# Altium footprint library Quectel.PCBLIB: 25 footprints (part 2 of 2)
Each footprint in its own frame and in the unit in brackets; x right, y up, seen from the top. Pads: shape width x height; smd on the part's side, far side on the other; paste and mask are expansions set on the pad; w line width, h text height; cw(c..) or ccw(c..) is an arc to the next point about the centre after c.
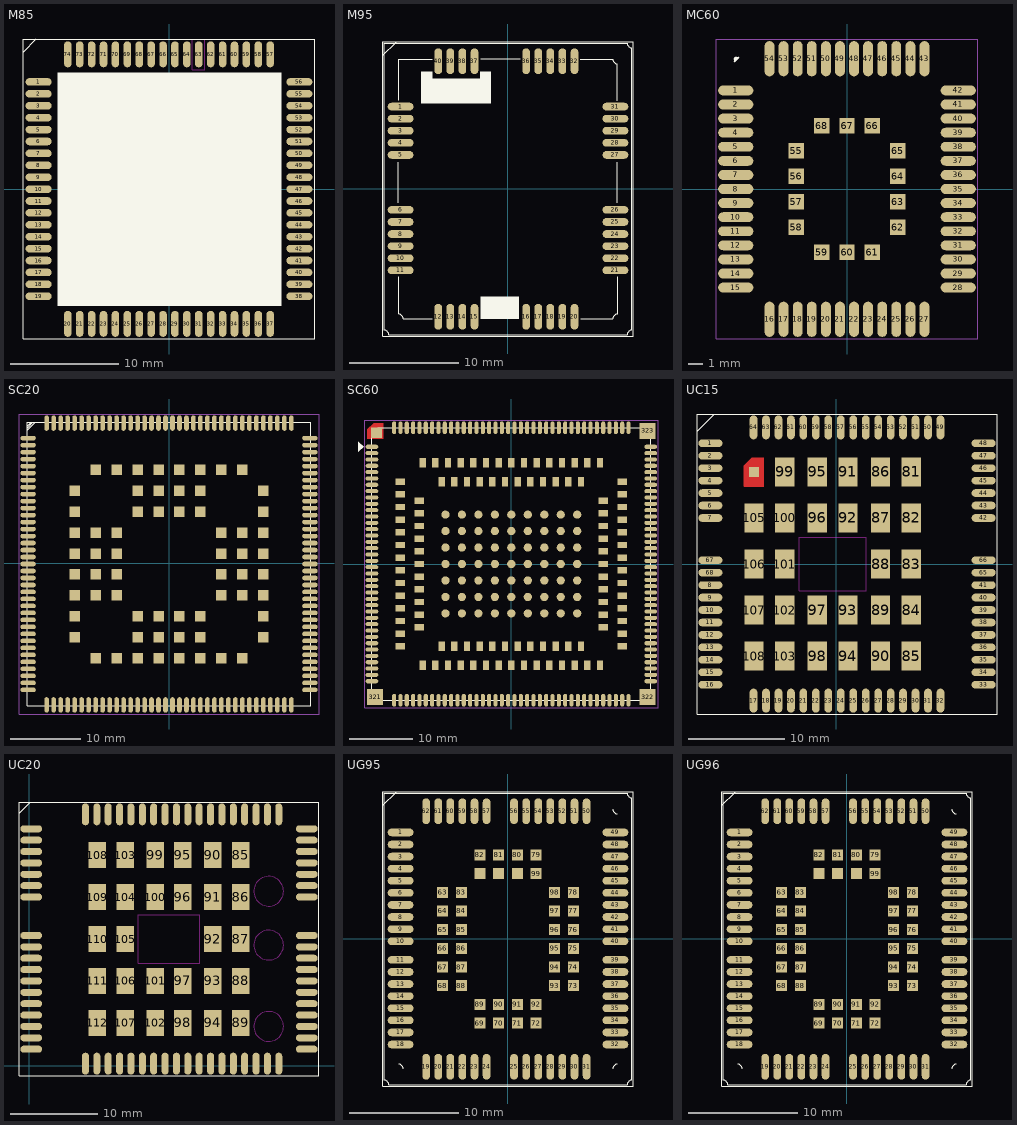
[diagram p1: the footprints below, top view; thin cyan lines are the x and y axes]

## M85 [mm]
pads (74):
  oval 2.4x0.7 smd: 1(-12.05,9.9) 2(-12.05,8.8) 3(-12.05,7.7) 4(-12.05,6.6) 5(-12.05,5.5) 6(-12.05,4.4) 7(-12.05,3.3) 8(-12.05,2.2) 9(-12.05,1.1) 10(-12.05,0) 11(-12.05,-1.1) 12(-12.05,-2.2) 13(-12.05,-3.3) 14(-12.05,-4.4) 15(-12.05,-5.5) 16(-12.05,-6.6) 17(-12.05,-7.7) 18(-12.05,-8.8) 19(-12.05,-9.9) 38(12.05,-9.9) 39(12.05,-8.8) 40(12.05,-7.7) 41(12.05,-6.6) 42(12.05,-5.5) 43(12.05,-4.4) 44(12.05,-3.3) 45(12.05,-2.2) 46(12.05,-1.1) 47(12.05,0) 48(12.05,1.1) 49(12.05,2.2) 50(12.05,3.3) 51(12.05,4.4) 52(12.05,5.5) 53(12.05,6.6) 54(12.05,7.7) 55(12.05,8.8) 56(12.05,9.9)
  oval 0.7x2.4 smd: 20(-9.35,-12.45) 21(-8.25,-12.45) 22(-7.15,-12.45) 23(-6.05,-12.45) 24(-4.95,-12.45) 25(-3.85,-12.45) 26(-2.75,-12.45) 27(-1.65,-12.45) 28(-0.55,-12.45) 29(0.55,-12.45) 30(1.65,-12.45) 31(2.75,-12.45) 32(3.85,-12.45) 33(4.95,-12.45) 34(6.05,-12.45) 35(7.15,-12.45) 36(8.25,-12.45) 37(9.35,-12.45) 57(9.35,12.45) 58(8.25,12.45) 59(7.15,12.45) 60(6.05,12.45) 61(4.95,12.45) 62(3.85,12.45) 63(2.75,12.45) 64(1.65,12.45) 65(0.55,12.45) 66(-0.55,12.45) 67(-1.65,12.45) 68(-2.75,12.45) 69(-3.85,12.45) 70(-4.95,12.45) 71(-6.05,12.45) 72(-7.15,12.45) 73(-8.25,12.45) 74(-9.35,12.45)
Top Overlay:
  rectangle: -10.287,-10.795 10.414,10.795
  lines w0.1: -13.45,-13.85 13.45,-13.85 13.45,13.85 -13.45,13.85 -13.45,-13.85
  lines w0.102: -13.437,12.675 -12.243,13.868
Keep-Out Layer:
  lines w0.102: 2.159,13.843 2.159,11.049 3.302,11.049 3.302,13.843
3D body "User Library-QuectelM85.step": height 2.6, standoff -0.01, extent -12.243,-12.649 12.257,12.651

## M95 [mm]
pads (40):
  oval 2.35x0.7 smd: 1(-9.775,7.5) 2(-9.775,6.4) 3(-9.775,5.3) 4(-9.775,4.2) 5(-9.775,3.1) 6(-9.775,-1.9) 7(-9.775,-3) 8(-9.775,-4.1) 9(-9.775,-5.2) 10(-9.775,-6.3) 11(-9.775,-7.4) 21(9.775,-7.4) 22(9.775,-6.3) 23(9.775,-5.2) 24(9.775,-4.1) 25(9.775,-3) 26(9.775,-1.9) 27(9.775,3.1) 28(9.775,4.2) 29(9.775,5.3) 30(9.775,6.4) 31(9.775,7.5)
  oval 0.7x2.35 smd: 12(-6.35,-11.625) 13(-5.25,-11.625) 14(-4.15,-11.625) 15(-3.05,-11.625) 16(1.65,-11.625) 17(2.75,-11.625) 18(3.85,-11.625) 19(4.95,-11.625) 20(6.05,-11.625) 32(6.05,11.625) 33(4.95,11.625) 34(3.85,11.625) 35(2.75,11.625) 36(1.65,11.625) 37(-3.05,11.625) 38(-4.15,11.625) 39(-5.25,11.625) 40(-6.35,11.625)
Top Overlay:
  rectangle: -2.565,7.772 -1.549,10.693
  rectangle: -7.899,7.772 -6.883,10.693
  rectangle: -7.01,7.772 -2.565,10.058
  rectangle: -2.489,-11.811 0.991,-9.804
  lines w0.1: -10.001,-1.27 -10.001,2.453 ; -9.95,-11.4 cw(c-9.95,-11.8) -9.55,-11.8 -6.883,-11.8 ; -9.95,-11.354 -9.95,-8.001 ; -9.95,8.077 -9.95,11.8 -6.883,11.8 ; -2.464,11.836 1.092,11.836 ; 6.579,11.786 9.55,11.786 ; 6.604,-11.8 9.55,-11.8 cw(c9.95,-11.8) 9.95,-11.4 ; 9.55,11.8 ccw(c9.95,11.8) 9.95,11.4 9.95,8.052 ; 9.938,-1.27 9.938,2.453 ; 9.989,-11.379 9.989,-7.976 ; -11.4,-13.4 -11.4,13.4 11.4,13.4 11.4,-13.4 -11.4,-13.4 ; -11.25,-12.85 cw(c-11.25,-13.25) -10.85,-13.25 10.85,-13.25 cw(c11.25,-13.25) 11.25,-12.85 11.25,12.85 cw(c11.25,13.25) 10.85,13.25 -11.25,13.25 -11.25,-12.85
  lines w0.102: -11.379,12.167 -10.185,13.36
3D body "M95_3d_150727_asm.stp": height 2.65, standoff 0, extent -9.957,-11.811 9.943,11.789

## MC60 [mm]
pads (68):
  oval 2.5x0.7 smd: 1(-7.9,7) 2(-7.9,6) 3(-7.9,5) 4(-7.9,4) 5(-7.9,3) 6(-7.9,2) 7(-7.9,1) 8(-7.9,0) 9(-7.9,-1) 10(-7.9,-2) 11(-7.9,-3) 12(-7.9,-4) 13(-7.9,-5) 14(-7.9,-6) 15(-7.9,-7) 28(7.9,-7) 29(7.9,-6) 30(7.9,-5) 31(7.9,-4) 32(7.9,-3) 33(7.9,-2) 34(7.9,-1) 35(7.9,0) 36(7.9,1) 37(7.9,2) 38(7.9,3) 39(7.9,4) 40(7.9,5) 41(7.9,6) 42(7.9,7)
  oval 0.7x2.5 smd: 16(-5.5,-9.25) 17(-4.5,-9.25) 18(-3.5,-9.25) 19(-2.5,-9.25) 20(-1.5,-9.25) 21(-0.5,-9.25) 22(0.5,-9.25) 23(1.5,-9.25) 24(2.5,-9.25) 25(3.5,-9.25) 26(4.5,-9.25) 27(5.5,-9.25) 43(5.5,9.25) 44(4.5,9.25) 45(3.5,9.25) 46(2.5,9.25) 47(1.5,9.25) 48(0.5,9.25) 49(-0.5,9.25) 50(-1.5,9.25) 51(-2.5,9.25) 52(-3.5,9.25) 53(-4.5,9.25) 54(-5.5,9.25)
  rect 1.1x1.1 smd: 55(-3.6,2.7) 56(-3.6,0.9) 57(-3.6,-0.9) 58(-3.6,-2.7) 59(-1.8,-4.5) 60(0,-4.5) 61(1.8,-4.5) 62(3.6,-2.7) 63(3.6,-0.9) 64(3.6,0.9) 65(3.6,2.7) 66(1.8,4.5) 67(0,4.5) 68(-1.8,4.5)
Top Overlay:
  lines w0.1: -8,9.05 -7.7,9.35 ; -8,9.15 -7.8,9.35 ; -8,9.25 -7.9,9.35
Mechanical 1:
  lines w0.01: -9.3,-10.65 -9.3,10.65 9.3,10.65 9.3,-10.65 -9.3,-10.65
3D body "Quectel MC60.step": height 2.1, standoff 0, extent -8.001,-9.351 8.001,9.351

## SC20 [mm]
pads (210):
  oval 2.2x0.65 smd mask+0.05: 1(-20.15,17.873) 2(-20.15,16.873) 3(-20.15,15.873) 4(-20.15,14.873) 5(-20.15,13.873) 6(-20.15,12.873) 7(-20.15,11.873) 8(-20.15,10.873) 9(-20.15,9.873) 10(-20.15,8.873) 11(-20.15,7.873) 12(-20.15,6.873) 13(-20.15,5.873) 14(-20.15,4.873) 15(-20.15,3.873) 16(-20.15,2.873) 17(-20.15,1.873) 18(-20.15,0.873) 19(-20.15,-0.127) 20(-20.15,-1.127) 21(-20.15,-2.127) 22(-20.15,-3.127) 23(-20.15,-4.127) 24(-20.15,-5.127) 25(-20.15,-6.127) 26(-20.15,-7.127) 27(-20.15,-8.127) 28(-20.15,-9.127) 29(-20.15,-10.127) 30(-20.15,-11.127) 31(-20.15,-12.127) 32(-20.15,-13.127) 33(-20.15,-14.127) 34(-20.15,-15.127) 35(-20.15,-16.127) 36(-20.15,-17.127) 37(-20.15,-18.127) 74(20.15,-18.127) 75(20.15,-17.127) 76(20.15,-16.127) 77(20.15,-15.127) 78(20.15,-14.127) 79(20.15,-13.127) 80(20.15,-12.127) 81(20.15,-11.127) 82(20.15,-10.127) 83(20.15,-9.127) 84(20.15,-8.127) 85(20.15,-7.127) 86(20.15,-6.127) 87(20.15,-5.127) 88(20.15,-4.127) 89(20.15,-3.127) 90(20.15,-2.127) 91(20.15,-1.127) 92(20.15,-0.127) 93(20.15,0.873) 94(20.15,1.873) 95(20.15,2.873) 96(20.15,3.873) 97(20.15,4.873) 98(20.15,5.873) 99(20.15,6.873) 100(20.15,7.873) 101(20.15,8.873) 102(20.15,9.873) 103(20.15,10.873) 104(20.15,11.873) 105(20.15,12.873) 106(20.15,13.873) 107(20.15,14.873) 108(20.15,15.873) 109(20.15,16.873) 110(20.15,17.873)
  oval 0.65x2.2 smd mask+0.05: 38(-17.5,-20.277) 39(-16.5,-20.277) 40(-15.5,-20.277) 41(-14.5,-20.277) 42(-13.5,-20.277) 43(-12.5,-20.277) 44(-11.5,-20.277) 45(-10.5,-20.277) 46(-9.5,-20.277) 47(-8.5,-20.277) 48(-7.5,-20.277) 49(-6.5,-20.277) 50(-5.5,-20.277) 51(-4.5,-20.277) 52(-3.5,-20.277) 53(-2.5,-20.277) 54(-1.5,-20.277) 55(-0.5,-20.277) 56(0.5,-20.277) 57(1.5,-20.277) 58(2.5,-20.277) 59(3.5,-20.277) 60(4.5,-20.277) 61(5.5,-20.277) 62(6.5,-20.277) 63(7.5,-20.277) 64(8.5,-20.277) 65(9.5,-20.277) 66(10.5,-20.277) 67(11.5,-20.277) 68(12.5,-20.277) 69(13.5,-20.277) 70(14.5,-20.277) 71(15.5,-20.277) 72(16.5,-20.277) 73(17.5,-20.277) 111(17.5,20.023) 112(16.5,20.023) 113(15.5,20.023) 114(14.5,20.023) 115(13.5,20.023) 116(12.5,20.023) 117(11.5,20.023) 118(10.5,20.023) 119(9.5,20.023) 120(8.5,20.023) 121(7.5,20.023) 122(6.5,20.023) 123(5.5,20.023) 124(4.5,20.023) 125(3.5,20.023) 126(2.5,20.023) 127(1.5,20.023) 128(0.5,20.023) 129(-0.5,20.023) 130(-1.5,20.023) 131(-2.5,20.023) 132(-3.5,20.023) 133(-4.5,20.023) 134(-5.5,20.023) 135(-6.5,20.023) 136(-7.5,20.023) 137(-8.5,20.023) 138(-9.5,20.023) 139(-10.5,20.023) 140(-11.5,20.023) 141(-12.5,20.023) 142(-13.5,20.023) 143(-14.5,20.023) 144(-15.5,20.023) 145(-16.5,20.023) 146(-17.5,20.023)
  rect 1.5x1.5 smd mask+0.05: 147(-13.5,10.373) 148(-13.5,7.373) 149(-13.5,4.373) 150(-13.5,1.373) 151(-13.5,-1.627) 152(-13.5,-4.627) 153(-13.5,-7.627) 154(-13.5,-10.627) 155(-10.5,-13.627) 156(-7.5,-13.627) 157(-4.5,-13.627) 158(-1.5,-13.627) 159(1.5,-13.627) 160(4.5,-13.627) 161(7.5,-13.627) 162(10.5,-13.627) 163(13.5,-10.627) 164(13.5,-7.627) 165(13.5,-4.627) 166(13.5,-1.627) 167(13.5,1.373) 168(13.5,4.373) 169(13.5,7.373) 170(13.5,10.373) 171(10.5,13.373) 172(7.5,13.373) 173(4.5,13.373) 174(1.5,13.373) 175(-1.5,13.373) 176(-4.5,13.373) 177(-7.5,13.373) 178(-10.5,13.373) 179(-10.5,4.373) 180(-10.5,1.373) 181(-10.5,-1.627) 182(-10.5,-4.627) 183(-4.5,-10.627) 184(-1.5,-10.627) 185(1.5,-10.627) 186(4.5,-10.627) 187(10.5,-4.627) 188(10.5,-1.627) 189(10.5,1.373) 190(10.5,4.373) 191(4.5,10.373) 192(1.5,10.373) 193(-1.5,10.373) 194(-4.5,10.373) 195(-7.5,4.373) 196(-7.5,1.373) 197(-7.5,-1.627) 198(-7.5,-4.627) 199(-4.5,-7.627) 200(-1.5,-7.627) 201(1.5,-7.627) 202(4.5,-7.627) 203(7.5,-4.627) 204(7.5,-1.627) 205(7.5,1.373) 206(7.5,4.373) 207(4.5,7.373) 208(1.5,7.373) 209(-1.5,7.373) 210(-4.5,7.373)
Top Overlay:
  lines w0.1: -20.2,19.073 -19.2,20.073 ; -20.2,19.373 -19.45,20.123 ; -20.2,19.673 -19.8,20.073 ; -20.25,-20.377 -20.25,20.123 20.25,20.123 20.25,-20.377 -20.25,-20.377
Mechanical 1:
  lines w0.01: -21.45,-21.577 -21.45,21.323 21.45,21.323 21.45,-21.577 -21.45,-21.577

## SC60 [mm]
pads (323):
  oval 2x0.65 smd mask+0.05: 1(-22,18.5) 2(-22,17.5) 3(-22,16.5) 4(-22,15.5) 5(-22,14.5) 6(-22,13.5) 7(-22,12.5) 8(-22,11.5) 9(-22,10.5) 10(-22,9.5) 11(-22,8.5) 12(-22,7.5) 13(-22,6.5) 14(-22,5.5) 15(-22,4.5) 16(-22,3.5) 17(-22,2.5) 18(-22,1.5) 19(-22,0.5) 20(-22,-0.5) 21(-22,-1.5) 22(-22,-2.5) 23(-22,-3.5) 24(-22,-4.5) 25(-22,-5.5) 26(-22,-6.5) 27(-22,-7.5) 28(-22,-8.5) 29(-22,-9.5) 30(-22,-10.5) 31(-22,-11.5) 32(-22,-12.5) 33(-22,-13.5) 34(-22,-14.5) 35(-22,-15.5) 36(-22,-16.5) 37(-22,-17.5) 38(-22,-18.5) 77(22,-18.5) 78(22,-17.5) 79(22,-16.5) 80(22,-15.5) 81(22,-14.5) 82(22,-13.5) 83(22,-12.5) 84(22,-11.5) 85(22,-10.5) 86(22,-9.5) 87(22,-8.5) 88(22,-7.5) 89(22,-6.5) 90(22,-5.5) 91(22,-4.5) 92(22,-3.5) 93(22,-2.5) 94(22,-1.5) 95(22,-0.5) 96(22,0.5) 97(22,1.5) 98(22,2.5) 99(22,3.5) 100(22,4.5) 101(22,5.5) 102(22,6.5) 103(22,7.5) 104(22,8.5) 105(22,9.5) 106(22,10.5) 107(22,11.5) 108(22,12.5) 109(22,13.5) 110(22,14.5) 111(22,15.5) 112(22,16.5) 113(22,17.5) 114(22,18.5)
  oval 0.65x2 smd mask+0.05: 39(-18.5,-21.5) 40(-17.5,-21.5) 41(-16.5,-21.5) 42(-15.5,-21.5) 43(-14.5,-21.5) 44(-13.5,-21.5) 45(-12.5,-21.5) 46(-11.5,-21.5) 47(-10.5,-21.5) 48(-9.5,-21.5) 49(-8.5,-21.5) 50(-7.5,-21.5) 51(-6.5,-21.5) 52(-5.5,-21.5) 53(-4.5,-21.5) 54(-3.5,-21.5) 55(-2.5,-21.5) 56(-1.5,-21.5) 57(-0.5,-21.5) 58(0.5,-21.5) 59(1.5,-21.5) 60(2.5,-21.5) 61(3.5,-21.5) 62(4.5,-21.5) 63(5.5,-21.5) 64(6.5,-21.5) 65(7.5,-21.5) 66(8.5,-21.5) 67(9.5,-21.5) 68(10.5,-21.5) 69(11.5,-21.5) 70(12.5,-21.5) 71(13.5,-21.5) 72(14.5,-21.5) 73(15.5,-21.5) 74(16.5,-21.5) 75(17.5,-21.5) 76(18.5,-21.5) 115(18.5,21.5) 116(17.5,21.5) 117(16.5,21.5) 118(15.5,21.5) 119(14.5,21.5) 120(13.5,21.5) 121(12.5,21.5) 122(11.5,21.5) 123(10.5,21.5) 124(9.5,21.5) 125(8.5,21.5) 126(7.5,21.5) 127(6.5,21.5) 128(5.5,21.5) 129(4.5,21.5) 130(3.5,21.5) 131(2.5,21.5) 132(1.5,21.5) 133(0.5,21.5) 134(-0.5,21.5) 135(-1.5,21.5) 136(-2.5,21.5) 137(-3.5,21.5) 138(-4.5,21.5) 139(-5.5,21.5) 140(-6.5,21.5) 141(-7.5,21.5) 142(-8.5,21.5) 143(-9.5,21.5) 144(-10.5,21.5) 145(-11.5,21.5) 146(-12.5,21.5) 147(-13.5,21.5) 148(-14.5,21.5) 149(-15.5,21.5) 150(-16.5,21.5) 151(-17.5,21.5) 152(-18.5,21.5)
  rect 1.5x1 smd mask+0.05: 153(-17.5,13) 154(-17.5,11) 155(-17.5,9) 156(-17.5,7) 157(-17.5,5) 158(-17.5,3) 159(-17.5,1) 160(-17.5,-1) 161(-17.5,-3) 162(-17.5,-5) 163(-17.5,-7) 164(-17.5,-9) 165(-17.5,-11) 166(-17.5,-13) 182(17.5,-13) 183(17.5,-11) 184(17.5,-9) 185(17.5,-7) 186(17.5,-5) 187(17.5,-3) 188(17.5,-1) 189(17.5,1) 190(17.5,3) 191(17.5,5) 192(17.5,7) 193(17.5,9) 194(17.5,11) 195(17.5,13) 211(-14.5,10) 212(-14.5,8) 213(-14.5,6) 214(-14.5,4) 215(-14.5,2) 216(-14.5,0) 217(-14.5,-2) 218(-14.5,-4) 219(-14.5,-6) 220(-14.5,-8) 221(-14.5,-10) 234(14.5,-10) 235(14.5,-8) 236(14.5,-6) 237(14.5,-4) 238(14.5,-2) 239(14.5,0) 240(14.5,2) 241(14.5,4) 242(14.5,6) 243(14.5,8) 244(14.5,10)
  rect 1x1.5 smd mask+0.05: 167(-14,-16) 168(-12,-16) 169(-10,-16) 170(-8,-16) 171(-6,-16) 172(-4,-16) 173(-2,-16) 174(0,-16) 175(2,-16) 176(4,-16) 177(6,-16) 178(8,-16) 179(10,-16) 180(12,-16) 181(14,-16) 196(14,16) 197(12,16) 198(10,16) 199(8,16) 200(6,16) 201(4,16) 202(2,16) 203(0,16) 204(-2,16) 205(-4,16) 206(-6,16) 207(-8,16) 208(-10,16) 209(-12,16) 210(-14,16) 222(-11,-13) 223(-9,-13) 224(-7,-13) 225(-5,-13) 226(-3,-13) 227(-1,-13) 228(1,-13) 229(3,-13) 230(5,-13) 231(7,-13) 232(9,-13) 233(11,-13) 245(11,13) 246(9,13) 247(7,13) 248(5,13) 249(3,13) 250(1,13) 251(-1,13) 252(-3,13) 253(-5,13) 254(-7,13) 255(-9,13) 256(-11,13)
  round 1.3 smd mask+0.05: 257(-10.4,7.8) 258(-10.4,5.2) 259(-10.4,2.6) 260(-10.4,0) 261(-10.4,-2.6) 262(-10.4,-5.2) 263(-10.4,-7.8) 264(-7.8,7.8) 265(-7.8,5.2) 266(-7.8,2.6) 267(-7.8,0) 268(-7.8,-2.6) 269(-7.8,-5.2) 270(-7.8,-7.8) 271(-5.2,7.8) 272(-5.2,5.2) 273(-5.2,2.6) 274(-5.2,0) 275(-5.2,-2.6) 276(-5.2,-5.2) 277(-5.2,-7.8) 278(-2.6,7.8) 279(-2.6,5.2) 280(-2.6,2.6) 281(-2.6,0) 282(-2.6,-2.6) 283(-2.6,-5.2) 284(-2.6,-7.8) 285(0,7.8) 286(0,5.2) 287(0,2.6) 288(0,0) 289(0,-2.6) 290(0,-5.2) 291(0,-7.8) 292(2.6,7.8) 293(2.6,5.2) 294(2.6,2.6) 295(2.6,0) 296(2.6,-2.6) 297(2.6,-5.2) 298(2.6,-7.8) 299(5.2,7.8) 300(5.2,5.2) 301(5.2,2.6) 302(5.2,0) 303(5.2,-2.6) 304(5.2,-5.2) 305(5.2,-7.8) 306(7.8,7.8) 307(7.8,5.2) 308(7.8,2.6) 309(7.8,0) 310(7.8,-2.6) 311(7.8,-5.2) 312(7.8,-7.8) 313(10.4,7.8) 314(10.4,5.2) 315(10.4,2.6) 316(10.4,0) 317(10.4,-2.6) 318(10.4,-5.2) 319(10.4,-7.8)
  rect 1.7x1.7 smd: 320(-21.266,20.723)
  rect 2.5x2.5 smd mask+0.05: 321(-21.5,-21) 322(21.5,-21) 323(21.5,21)
Top Layer:
  region: -20.25,19.75 -20.25,22.25 -21.75,22.25 -22.75,21.25 -22.75,19.75
Top Overlay:
  region: -23.3,18.5 -24.2,19.271 -24.2,17.729
  lines w0.1: -22,-21.5 -22,20.5 -21,21.5 22,21.5 22,-21.5 -22,-21.5
Top Paste:
  region: -20.25,19.75 -20.25,22.25 -21.75,22.25 -22.75,21.25 -22.75,19.75
Top Solder:
  region: -20.2,19.7 -20.2,22.3 -21.8,22.3 -22.8,21.3 -22.8,19.7
Mechanical 1:
  lines w0.01: -23.15,-22.65 -23.15,22.65 23.15,22.65 23.15,-22.65 -23.15,-22.65

## UC15 [mm]
pads (108):
  oval 2.5x0.8 smd: 1(-13.107,12.6) 2(-13.107,11.3) 3(-13.107,10) 4(-13.107,8.7) 5(-13.107,7.4) 6(-13.107,6.1) 7(-13.107,4.8) 8(-13.107,-2.2) 9(-13.107,-3.5) 10(-13.107,-4.8) 11(-13.107,-6.1) 12(-13.107,-7.4) 13(-13.107,-8.7) 14(-13.107,-10) 15(-13.107,-11.3) 16(-13.107,-12.6) 33(15.393,-12.6) 34(15.393,-11.3) 35(15.393,-10) 36(15.393,-8.7) 37(15.393,-7.4) 38(15.393,-6.1) 39(15.393,-4.8) 40(15.393,-3.5) 41(15.393,-2.2) 42(15.393,4.8) 43(15.393,6.1) 44(15.393,7.4) 45(15.393,8.7) 46(15.393,10) 47(15.393,11.3) 48(15.393,12.6) 65(15.393,-0.9) 66(15.393,0.4) 67(-13.107,0.4) 68(-13.107,-0.9)
  oval 0.8x2.5 smd: 17(-8.607,-14.25) 18(-7.307,-14.25) 19(-6.007,-14.25) 20(-4.707,-14.25) 21(-3.407,-14.25) 22(-2.107,-14.25) 23(-0.807,-14.25) 24(0.493,-14.25) 25(1.793,-14.25) 26(3.093,-14.25) 27(4.393,-14.25) 28(5.693,-14.25) 29(6.993,-14.25) 30(8.293,-14.25) 31(9.593,-14.25) 32(10.893,-14.25) 49(10.893,14.25) 50(9.593,14.25) 51(8.293,14.25) 52(6.993,14.25) 53(5.693,14.25) 54(4.393,14.25) 55(3.093,14.25) 56(1.793,14.25) 57(0.493,14.25) 58(-0.807,14.25) 59(-2.107,14.25) 60(-3.407,14.25) 61(-4.707,14.25) 62(-6.007,14.25) 63(-7.307,14.25) 64(-8.607,14.25)
  rect 0x0 smd: 69(2.043,1.6) 70(2.043,0) 71(2.043,-1.6) 72(0.443,1.6) 73(0.443,0) 74(0.443,-1.6) 75(-1.157,1.6) 76(-1.157,0) 77(-1.157,-1.6) 78(-2.757,1.6) 79(-2.757,0) 80(-2.757,-1.6)
  rect 2x3 smd: 81(7.843,9.6) 82(7.843,4.8) 83(7.843,0) 84(7.843,-4.8) 85(7.843,-9.6) 86(4.643,9.6) 87(4.643,4.8) 88(4.643,0) 89(4.643,-4.8) 90(4.643,-9.6) 91(1.243,9.6) 92(1.243,4.8) 93(1.243,-4.8) 94(1.243,-9.6) 95(-1.957,9.6) 96(-1.957,4.8) 97(-1.957,-4.8) 98(-1.957,-9.6) 99(-5.357,9.6) 100(-5.357,4.8) 101(-5.357,0) 102(-5.357,-4.8) 103(-5.357,-9.6) 105(-8.557,4.8) 106(-8.557,0) 107(-8.557,-4.8) 108(-8.557,-9.6)
  rect 1x1 smd: 104(-8.557,9.6)
Top Layer:
  region: -8.738,11.074 -8.738,8.103 -7.569,8.103 -7.569,11.074
  region: -9.55,10.262 -9.55,8.128 -8.661,8.128 -8.661,10.262
  region: -9.096,9.801 -8.268,10.63 -8.738,11.1 -9.566,10.271
  lines w0.102: -9.557,8.1 -9.557,10.275 -8.732,11.1 -7.557,11.1 -7.557,8.1 -9.557,8.1
Top Layer keep-out:
  lines w0.102: -3.857,-2.8 -3.857,2.8 3.143,2.8 3.143,-2.8 -3.857,-2.8
Top Overlay:
  lines w0.1: -14.507,-15.65 16.793,-15.65 16.793,15.65 -14.507,15.65 -14.507,-15.65 ; -14.507,13.865 -12.722,15.625 -14.507,15.625 -14.507,13.865
Top Paste:
  region: -8.738,11.074 -8.738,8.103 -7.595,8.103 -7.595,11.074
  region: -9.525,10.262 -9.525,8.103 -8.687,8.103 -8.687,10.262
  region: -9.097,9.8 -8.268,10.63 -8.742,11.104 -9.572,10.274
  lines w0.102: -9.557,8.1 -9.557,10.275 -8.732,11.1 -7.557,11.1 -7.557,8.1 -9.557,8.1
Top Solder:
  region: -9.18,9.921 -8.395,10.706 -8.812,11.123 -9.597,10.338
  region: -9.601,10.338 -9.601,8.077 -8.788,8.077 -8.788,10.338
  region: -8.814,11.125 -8.814,8.077 -7.544,8.077 -7.544,11.125
  lines w0.102: -9.607,8.05 -9.607,10.325 -8.782,11.15 -7.507,11.15 -7.507,8.05 -9.607,8.05
3D body "uc15_3d_150714_asm.stp": height 2.5, standoff 0, extent -13.36,-14.503 15.64,14.497

## UC20 [mm]
pads (112):
  oval 2.5x0.8 smd: 1(0.238,27.093) 2(0.238,25.793) 3(0.238,24.493) 4(0.238,23.193) 5(0.238,21.893) 6(0.238,20.593) 7(0.238,19.293) 8(0.238,14.893) 9(0.238,13.593) 10(0.238,12.293) 11(0.238,10.993) 12(0.238,9.693) 13(0.238,8.393) 14(0.238,7.093) 15(0.238,5.793) 16(0.238,4.493) 17(0.238,3.193) 18(0.238,1.893) 37(31.738,1.893) 38(31.738,3.193) 39(31.738,4.493) 40(31.738,5.793) 41(31.738,7.093) 42(31.738,8.393) 43(31.738,9.693) 44(31.738,10.993) 45(31.738,12.293) 46(31.738,13.593) 47(31.738,14.893) 48(31.738,19.293) 49(31.738,20.593) 50(31.738,21.893) 51(31.738,23.193) 52(31.738,24.493) 53(31.738,25.793) 54(31.738,27.093)
  oval 0.8x2.5 smd: 19(6.438,0.243) 20(7.738,0.243) 21(9.038,0.243) 22(10.338,0.243) 23(11.638,0.243) 24(12.938,0.243) 25(14.238,0.243) 26(15.538,0.243) 27(16.838,0.243) 28(18.138,0.243) 29(19.438,0.243) 30(20.738,0.243) 31(22.038,0.243) 32(23.338,0.243) 33(24.638,0.243) 34(25.938,0.243) 35(27.238,0.243) 36(28.538,0.243) 55(28.538,28.743) 56(27.238,28.743) 57(25.938,28.743) 58(24.638,28.743) 59(23.338,28.743) 60(22.038,28.743) 61(20.738,28.743) 62(19.438,28.743) 63(18.138,28.743) 64(16.838,28.743) 65(15.538,28.743) 66(14.238,28.743) 67(12.938,28.743) 68(11.638,28.743) 69(10.338,28.743) 70(9.038,28.743) 71(7.738,28.743) 72(6.438,28.743)
  rect 0x0 smd: 73(18.388,16.093) 74(18.388,14.493) 75(18.388,12.893) 76(16.788,16.093) 77(16.788,14.493) 78(16.788,12.893) 79(15.188,16.093) 80(15.188,14.493) 81(15.188,12.893) 82(13.588,16.093) 83(13.588,14.493) 84(13.588,12.893)
  rect 2x3 smd: 85(24.188,24.093) 86(24.188,19.293) 87(24.188,14.493) 88(24.188,9.693) 89(24.188,4.893) 90(20.988,24.093) 91(20.988,19.293) 92(20.988,14.493) 93(20.988,9.693) 94(20.988,4.893) 95(17.588,24.093) 96(17.588,19.293) 97(17.588,9.693) 98(17.588,4.893) 99(14.388,24.093) 100(14.388,19.293) 101(14.388,9.693) 102(14.388,4.893) 103(10.988,24.093) 104(10.988,19.293) 105(10.988,14.493) 106(10.988,9.693) 107(10.988,4.893) 108(7.788,24.093) 109(7.788,19.293) 110(7.788,14.493) 111(7.788,9.693) 112(7.788,4.893)
Top Layer keep-out:
  circle w0.102: c27.385,4.493 r1.7
  circle w0.102: c27.385,13.793 r1.7
  circle w0.102: c27.385,19.954 r1.7
  lines w0.102: 12.488,17.272 12.488,11.693 19.488,11.693 19.488,17.293 ; 12.488,17.293 19.487,17.293
Top Overlay:
  lines w0.102: -1.162,30.143 -1.162,28.843 0.138,30.143 -1.162,30.143 ; -1.162,30.143 -1.162,-1.157 33.138,-1.157 33.138,30.143 -1.162,30.143
3D body "uc20_3d_150717_asm.stp": height 2.5, standoff 0, extent -0.012,-0.007 31.988,28.993

## UG95 [mm]
pads (102):
  oval 2.35x0.7 smd: 1(-9.775,9.7) 2(-9.775,8.6) 3(-9.775,7.5) 4(-9.775,6.4) 5(-9.775,5.3) 6(-9.775,4.2) 7(-9.775,3.1) 8(-9.775,2) 9(-9.775,0.9) 10(-9.775,-0.2) 11(-9.775,-1.9) 12(-9.775,-3) 13(-9.775,-4.1) 14(-9.775,-5.2) 15(-9.775,-6.3) 16(-9.775,-7.4) 17(-9.775,-8.5) 18(-9.775,-9.6) 32(9.775,-9.6) 33(9.775,-8.5) 34(9.775,-7.4) 35(9.775,-6.3) 36(9.775,-5.2) 37(9.775,-4.1) 38(9.775,-3) 39(9.775,-1.9) 40(9.775,-0.2) 41(9.775,0.9) 42(9.775,2) 43(9.775,3.1) 44(9.775,4.2) 45(9.775,5.3) 46(9.775,6.4) 47(9.775,7.5) 48(9.775,8.6) 49(9.775,9.7)
  oval 0.7x2.35 smd: 19(-7.45,-11.625) 20(-6.35,-11.625) 21(-5.25,-11.625) 22(-4.15,-11.625) 23(-3.05,-11.625) 24(-1.95,-11.625) 25(0.55,-11.625) 26(1.65,-11.625) 27(2.75,-11.625) 28(3.85,-11.625) 29(4.95,-11.625) 30(6.05,-11.625) 31(7.15,-11.625) 50(7.15,11.625) 51(6.05,11.625) 52(4.95,11.625) 53(3.85,11.625) 54(2.75,11.625) 55(1.65,11.625) 56(0.55,11.625) 57(-1.95,11.625) 58(-3.05,11.625) 59(-4.15,11.625) 60(-5.25,11.625) 61(-6.35,11.625) 62(-7.45,11.625)
  rect 1x1 smd: 63(-5.95,4.25) 64(-5.95,2.55) 65(-5.95,0.85) 66(-5.95,-0.85) 67(-5.95,-2.55) 68(-5.95,-4.25) 69(-2.55,-7.65) 70(-0.85,-7.65) 71(0.85,-7.65) 72(2.55,-7.65) 73(5.95,-4.25) 74(5.95,-2.55) 75(5.95,-0.85) 76(5.95,0.85) 77(5.95,2.55) 78(5.95,4.25) 79(2.55,7.65) 80(0.85,7.65) 81(-0.85,7.65) 82(-2.55,7.65) 83(-4.25,4.25) 84(-4.25,2.55) 85(-4.25,0.85) 86(-4.25,-0.85) 87(-4.25,-2.55) 88(-4.25,-4.25) 89(-2.55,-5.95) 90(-0.85,-5.95) 91(0.85,-5.95) 92(2.55,-5.95) 93(4.25,-4.25) 94(4.25,-2.55) 95(4.25,-0.85) 96(4.25,0.85) 97(4.25,2.55) 98(4.25,4.25) 99(2.55,5.95) 100(0.85,5.95) 101(-0.85,5.95) 102(-2.55,5.95)
Top Overlay:
  lines w0.1: -9.95,-11.4 cw(c-9.95,-11.8) -9.55,-11.8 ; 9.55,-11.8 cw(c9.95,-11.8) 9.95,-11.4 ; 9.55,11.8 ccw(c9.95,11.8) 9.95,11.4 ; -11.4,-13.4 -11.4,13.4 11.4,13.4 11.4,-13.4 -11.4,-13.4 ; -11.25,-12.85 cw(c-11.25,-13.25) -10.85,-13.25 10.85,-13.25 cw(c11.25,-13.25) 11.25,-12.85 11.25,12.85 cw(c11.25,13.25) 10.85,13.25 -11.25,13.25 -11.25,-12.85
  lines w0.102: -11.379,12.167 -10.185,13.36
3D body "ug95_3d_150810_asm.stp": height 2.2, standoff 0, extent -9.931,-11.811 9.969,11.789

## UG96 [mm]
pads (102):
  oval 2.35x0.7 smd: 1(-9.775,9.7) 2(-9.775,8.6) 3(-9.775,7.5) 4(-9.775,6.4) 5(-9.775,5.3) 6(-9.775,4.2) 7(-9.775,3.1) 8(-9.775,2) 9(-9.775,0.9) 10(-9.775,-0.2) 11(-9.775,-1.9) 12(-9.775,-3) 13(-9.775,-4.1) 14(-9.775,-5.2) 15(-9.775,-6.3) 16(-9.775,-7.4) 17(-9.775,-8.5) 18(-9.775,-9.6) 32(9.775,-9.6) 33(9.775,-8.5) 34(9.775,-7.4) 35(9.775,-6.3) 36(9.775,-5.2) 37(9.775,-4.1) 38(9.775,-3) 39(9.775,-1.9) 40(9.775,-0.2) 41(9.775,0.9) 42(9.775,2) 43(9.775,3.1) 44(9.775,4.2) 45(9.775,5.3) 46(9.775,6.4) 47(9.775,7.5) 48(9.775,8.6) 49(9.775,9.7)
  oval 0.7x2.35 smd: 19(-7.45,-11.625) 20(-6.35,-11.625) 21(-5.25,-11.625) 22(-4.15,-11.625) 23(-3.05,-11.625) 24(-1.95,-11.625) 25(0.55,-11.625) 26(1.65,-11.625) 27(2.75,-11.625) 28(3.85,-11.625) 29(4.95,-11.625) 30(6.05,-11.625) 31(7.15,-11.625) 50(7.15,11.625) 51(6.05,11.625) 52(4.95,11.625) 53(3.85,11.625) 54(2.75,11.625) 55(1.65,11.625) 56(0.55,11.625) 57(-1.95,11.625) 58(-3.05,11.625) 59(-4.15,11.625) 60(-5.25,11.625) 61(-6.35,11.625) 62(-7.45,11.625)
  rect 1x1 smd: 63(-5.95,4.25) 64(-5.95,2.55) 65(-5.95,0.85) 66(-5.95,-0.85) 67(-5.95,-2.55) 68(-5.95,-4.25) 69(-2.55,-7.65) 70(-0.85,-7.65) 71(0.85,-7.65) 72(2.55,-7.65) 73(5.95,-4.25) 74(5.95,-2.55) 75(5.95,-0.85) 76(5.95,0.85) 77(5.95,2.55) 78(5.95,4.25) 79(2.55,7.65) 80(0.85,7.65) 81(-0.85,7.65) 82(-2.55,7.65) 83(-4.25,4.25) 84(-4.25,2.55) 85(-4.25,0.85) 86(-4.25,-0.85) 87(-4.25,-2.55) 88(-4.25,-4.25) 89(-2.55,-5.95) 90(-0.85,-5.95) 91(0.85,-5.95) 92(2.55,-5.95) 93(4.25,-4.25) 94(4.25,-2.55) 95(4.25,-0.85) 96(4.25,0.85) 97(4.25,2.55) 98(4.25,4.25) 99(2.55,5.95) 100(0.85,5.95) 101(-0.85,5.95) 102(-2.55,5.95)
Top Overlay:
  lines w0.1: -9.95,-11.4 cw(c-9.95,-11.8) -9.55,-11.8 ; 9.55,-11.8 cw(c9.95,-11.8) 9.95,-11.4 ; 9.55,11.8 ccw(c9.95,11.8) 9.95,11.4 ; -11.4,-13.4 11.4,-13.4 11.4,13.4 -11.4,13.4 -11.4,-13.4 ; -11.25,-12.85 cw(c-11.25,-13.25) -10.85,-13.25 10.85,-13.25 cw(c11.25,-13.25) 11.25,-12.85 11.25,12.85 cw(c11.25,13.25) 10.85,13.25 -11.25,13.25 -11.25,-12.85
  lines w0.102: -11.379,12.167 -10.185,13.36
3D body "ug96_3d_150810_asm.stp": height 2.2, standoff 0, extent -11.252,-13.259 11.248,13.241